# Altium footprint library 封装库.PcbLib: 755 footprints (part 41 of 48)
Each footprint in its own frame and in the unit in brackets; x right, y up, seen from the top. Pads: shape width x height; smd on the part's side, far side on the other; paste and mask are expansions set on the pad; w line width, h text height; cw(c..) or ccw(c..) is an arc to the next point about the centre after c.
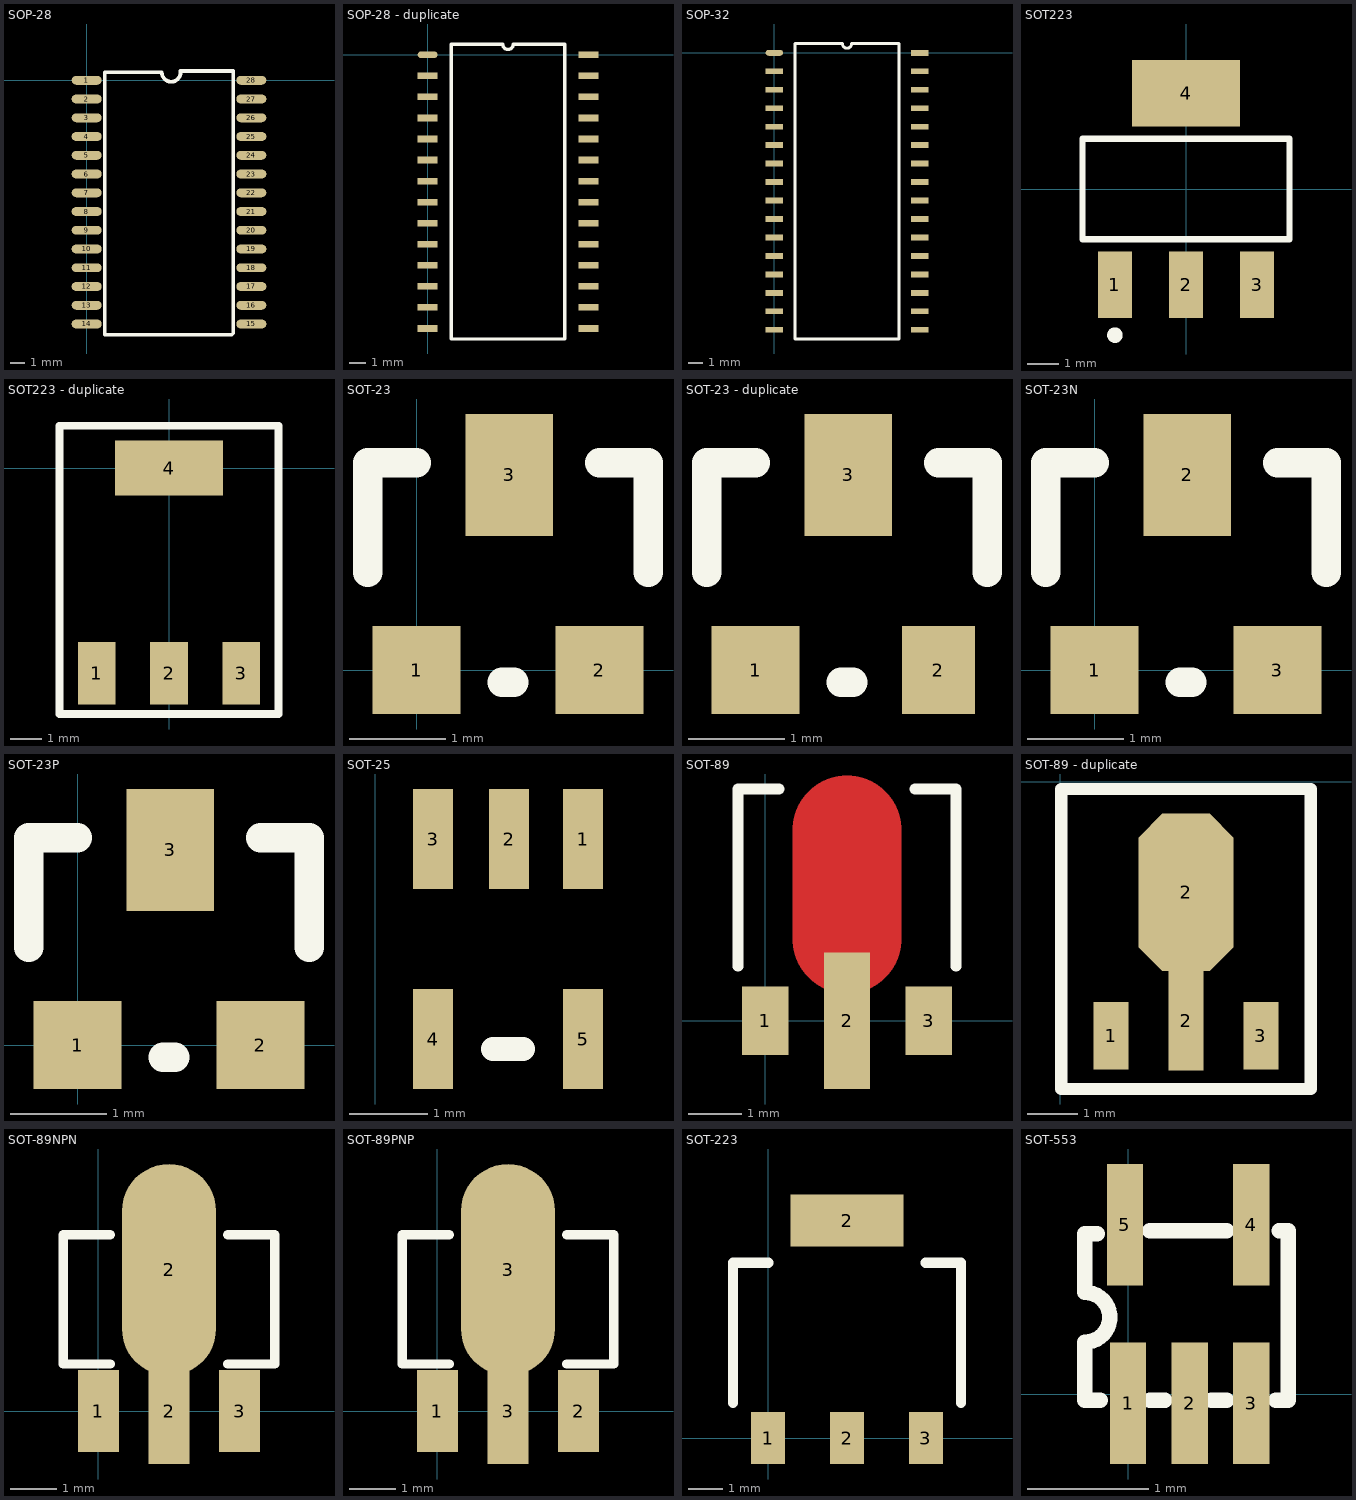
[diagram p40: the footprints below, top view; thin cyan lines are the x and y axes]

## SOP-28 [mil]
pads (28):
  oval 80x24 smd: 1(0,0) 2(0,-50) 3(0,-100) 4(0,-150) 5(0,-200) 6(0,-250) 7(0,-300) 8(0,-350) 9(0,-400) 10(0,-450) 11(0,-500) 12(0,-550) 13(0,-600) 14(0,-650) 15(439.29,-650) 16(439.29,-600) 17(439.29,-550) 18(439.29,-500) 19(439.29,-450) 20(439.29,-400) 21(439.29,-350) 22(439.29,-300) 23(439.29,-250) 24(439.29,-200) 25(439.29,-150) 26(439.29,-100) 27(439.29,-50) 28(439.29,0)
Top Overlay:
  lines w10: 196.61,21.06 48.19,21.06 48.19,-678.94 387.17,-678.94 ; 200.55,21.06 ccw(c225.55,21.06) 250.55,21.06 ; 250.55,25 391.1,25 391.1,-675

## SOP-28 - duplicate [mm] "stc"
pads (28):
  oval 1.2x0.4 smd: 1(0,0)
  rect 1.2x0.4 smd: 2(0,-1.27) 3(0,-2.54) 4(0,-3.81) 5(0,-5.08) 6(0,-6.35) 7(0,-7.62) 8(0,-8.89) 9(0,-10.16) 10(0,-11.43) 11(0,-12.7) 12(0,-13.97) 13(0,-15.24) 14(0,-16.51) 15(9.7,-16.51) 16(9.7,-15.24) 17(9.7,-13.97) 18(9.7,-12.7) 19(9.7,-11.43) 20(9.7,-10.16) 21(9.7,-8.89) 22(9.7,-7.62) 23(9.7,-6.35) 24(9.7,-5.08) 25(9.7,-3.81) 26(9.7,-2.54) 27(9.7,-1.27) 28(9.7,0)
Top Overlay:
  lines w0.2: 1.435,-17.145 8.265,-17.145 8.265,0.635 5.168,0.635 cw(c4.85,0.635) 4.533,0.635 1.435,0.635 1.435,-17.145

## SOP-32 [mm] "stc"
pads (32):
  oval 1.2x0.4 smd: 1(0,0)
  rect 1.2x0.4 smd: 2(0,-1.27) 3(0,-2.54) 4(0,-3.81) 5(0,-5.08) 6(0,-6.35) 7(0,-7.62) 8(0,-8.89) 9(0,-10.16) 10(0,-11.43) 11(0,-12.7) 12(0,-13.97) 13(0,-15.24) 14(0,-16.51) 15(0,-17.78) 16(0,-19.05) 17(10,-19.05) 18(10,-17.78) 19(10,-16.51) 20(10,-15.24) 21(10,-13.97) 22(10,-12.7) 23(10,-11.43) 24(10,-10.16) 25(10,-8.89) 26(10,-7.62) 27(10,-6.35) 28(10,-5.08) 29(10,-3.81) 30(10,-2.54) 31(10,-1.27) 32(10,0)
Top Overlay:
  lines w0.2: 1.435,-19.685 1.435,0.635 4.683,0.635 ccw(c5,0.635) 5.318,0.635 8.565,0.635 8.565,-19.685 1.435,-19.685

## SOT223 [mm] "SOT-223/SC-73; 4 Leads; Body 6.7 x 7.3 mm, inc. leads (LxW max)"
height 1.8
pads (4):
  rect 1.1x2.15 smd: 1(-2.3,-3.1) 2(0,-3.1) 3(2.3,-3.1)
  rect 3.5x2.15 smd: 4(0,3.1)
Top Overlay:
  circle w0.25: c-2.3,-4.725 r0.125
  lines w0.2: -3.35,-1.625 3.35,-1.625 3.35,1.625 -3.35,1.625 -3.35,-1.625

## SOT223 - duplicate [mm]
pads (4):
  rect 1.2x2 smd: 1(-2.308,-6.55) 2(-0.008,-6.55) 3(2.292,-6.55)
  rect 3.45x1.75 smd: 4(-0.008,0)
Top Overlay:
  lines w0.25: -3.508,-7.85 -3.508,1.35 3.492,1.35 3.492,-7.85 -3.508,-7.85

## SOT-23 [mil]
pads (3):
  rect 36x36 smd: 1(0,0) 2(75,0)
  rect 36x50 smd: 3(38,80)
Top Overlay:
  lines w12: -20,40 -20,85 0,85 ; 35,-5 40,-5 ; 75,85 95,85 95,40

## SOT-23 - duplicate [mil]
pads (3):
  rect 36x36 smd: 1(47.76,-120.28)
  rect 30x36 smd: 2(122.75,-120.28)
  rect 36x50 smd: 3(85.75,-40.28)
Top Overlay:
  lines w12: 27.75,-80.28 27.75,-35.28 47.76,-35.28 ; 82.75,-125.28 87.75,-125.28 ; 122.75,-35.28 142.75,-35.28 142.75,-80.28

## SOT-23N [mil]
pads (3):
  rect 36x36 smd: 1(0,0) 3(75,0)
  rect 36x50 smd: 2(38,80)
Top Overlay:
  lines w12: -20,40 -20,85 0,85 ; 35,-5 40,-5 ; 75,85 95,85 95,40

## SOT-23P [mil]
pads (3):
  rect 36x36 smd: 1(0,0) 2(75,0)
  rect 36x50 smd: 3(38,80)
Top Overlay:
  lines w12: -20,40 -20,85 0,85 ; 35,-5 40,-5 ; 75,85 95,85 95,40

## SOT-25 [mil]
pads (5):
  rect 20x50 smd: 1(104,-40) 2(67,-40) 3(29,-40) 4(29,-140) 5(104,-140)
Top Overlay:
  lines w12: 59,-145 74,-145

## SOT-89 [mil]
pads (3):
  rect 34x50 smd: 1(0,0) 3(120,0)
  rect 34x100 smd: 2(60,0)
Top Layer:
  lines w80: 60,60 60,140
Top Overlay:
  lines w8: -20,40 -20,170 10,170 ; 110,170 140,170 140,40

## SOT-89 - duplicate [mm]
pads (4):
  rect 0.7x1.35 smd: 1(1.016,-5.08) 3(4.016,-5.08)
  rect 0.7x1.99 smd: 2(2.516,-4.785)
  oct 1.9x3.15 smd: 2(2.516,-2.215)
Top Overlay:
  lines w0.25: 0.016,-6.148 5.016,-6.148 5.016,-0.147 0.016,-0.147 0.016,-6.148

## SOT-89NPN [mil]
pads (4):
  rect 35x70 smd: 1(0,0) 3(120,0)
  rect 35x90 smd: 2(60,0)
  oval 80x180 smd: 2(60,120)
Top Overlay:
  lines w8: 10,40 -30,40 -30,150 10,150 ; 110,40 150,40 150,150 110,150

## SOT-89PNP [mil]
pads (4):
  rect 35x70 smd: 1(0,0) 2(120,0)
  rect 35x90 smd: 3(60,0)
  oval 80x180 smd: 3(60,120)
Top Overlay:
  lines w8: 10,40 -30,40 -30,150 10,150 ; 110,40 150,40 150,150 110,150

## SOT-223 [mil]
pads (4):
  rect 39x59 smd: 1(0,0) 3(180,0)
  rect 38.98x59.06 smd: 2(90,0)
  rect 129.13x59 smd: 2(90,248.03)
Top Overlay:
  lines w11.81: -40,40 -40,200 0,200 ; 180,200 220,200 220,40

## SOT-553 [mm]
pads (5):
  rect 0.3x1 smd: 1(0,-0.076) 2(0.508,-0.076) 3(1.016,-0.076) 4(1.016,1.397) 5(-0.025,1.397)
Top Overlay:
  lines w0.127: -0.254,1.321 -0.356,1.321 -0.356,0.838 cw(c-0.356,0.633) -0.356,0.429 -0.356,-0.051 -0.229,-0.051 ; 0.178,-0.051 0.305,-0.051 ; 0.178,1.346 0.813,1.346 ; 0.686,-0.051 0.813,-0.051 ; 1.219,-0.051 1.321,-0.051 1.321,1.346 1.245,1.346